# Altium footprint library con-samtec.PCBLIB: 805 footprints (part 48 of 55) (continued)
## TSW-142-02-S-D-RA [mil] (continued)
  rectangle: 340,0 360,170
  rectangle: 440,0 460,170
  rectangle: 540,0 560,170
  rectangle: 640,0 660,170
  rectangle: 740,0 760,170
  rectangle: 840,0 860,170
  rectangle: 940,0 960,170
  rectangle: 1040,0 1060,170
  rectangle: 1140,0 1160,170
  rectangle: 1240,0 1260,170
  rectangle: 1340,0 1360,170
  rectangle: 1440,0 1460,170
  rectangle: 1540,0 1560,170
  rectangle: 1640,0 1660,170
  rectangle: 1740,0 1760,170
  rectangle: 1840,0 1860,170
  rectangle: 1940,0 1960,170
  rectangle: 2040,0 2060,170

## TSW-142-02-S-Q [mm]
pads (84):
  oct 1.5x1.5 hole 1: 1(52.07,-2.54) 2(52.07,2.54) 3(49.53,-2.54) 4(49.53,2.54) 5(46.99,-2.54) 6(46.99,2.54) 7(44.45,-2.54) 8(44.45,2.54) 9(41.91,-2.54) 10(41.91,2.54) 11(39.37,-2.54) 12(39.37,2.54) 13(36.83,-2.54) 14(36.83,2.54) 15(34.29,-2.54) 16(34.29,2.54) 17(31.75,-2.54) 18(31.75,2.54) 19(29.21,-2.54) 20(29.21,2.54) 21(26.67,-2.54) 22(26.67,2.54) 23(24.13,-2.54) 24(24.13,2.54) 25(21.59,-2.54) 26(21.59,2.54) 27(19.05,-2.54) 28(19.05,2.54) 29(16.51,-2.54) 30(16.51,2.54) 31(13.97,-2.54) 32(13.97,2.54) 33(11.43,-2.54) 34(11.43,2.54) 35(8.89,-2.54) 36(8.89,2.54) 37(6.35,-2.54) 38(6.35,2.54) 39(3.81,-2.54) 40(3.81,2.54) 41(1.27,-2.54) 42(1.27,2.54) 43(-1.27,-2.54) 44(-1.27,2.54) 45(-3.81,-2.54) 46(-3.81,2.54) 47(-6.35,-2.54) 48(-6.35,2.54) 49(-8.89,-2.54) 50(-8.89,2.54) 51(-11.43,-2.54) 52(-11.43,2.54) 53(-13.97,-2.54) 54(-13.97,2.54) 55(-16.51,-2.54) 56(-16.51,2.54) 57(-19.05,-2.54) 58(-19.05,2.54) 59(-21.59,-2.54) 60(-21.59,2.54) 61(-24.13,-2.54) 62(-24.13,2.54) 63(-26.67,-2.54) 64(-26.67,2.54) 65(-29.21,-2.54) 66(-29.21,2.54) 67(-31.75,-2.54) 68(-31.75,2.54) 69(-34.29,-2.54) 70(-34.29,2.54) 71(-36.83,-2.54) 72(-36.83,2.54) 73(-39.37,-2.54) 74(-39.37,2.54) 75(-41.91,-2.54) 76(-41.91,2.54) 77(-44.45,-2.54) 78(-44.45,2.54) 79(-46.99,-2.54) 80(-46.99,2.54) 81(-49.53,-2.54) 82(-49.53,2.54) 83(-52.07,-2.54) 84(-52.07,2.54)
Top Overlay:
  lines w0.203: -53.469,-3.695 53.469,-3.695 53.469,3.695 -53.469,3.695 -53.469,-3.695
  text "1" at 51.912,-5.138 h0.94
  text "2" at 51.812,3.989 h0.94
Mechanical 16:
  rectangle: -52.42,-2.89 -51.72,-2.19
  rectangle: -52.42,2.19 -51.72,2.89
  rectangle: -49.88,-2.89 -49.18,-2.19
  rectangle: -49.88,2.19 -49.18,2.89
  rectangle: -47.34,-2.89 -46.64,-2.19
  rectangle: -47.34,2.19 -46.64,2.89
  rectangle: -44.8,-2.89 -44.1,-2.19
  rectangle: -44.8,2.19 -44.1,2.89
  rectangle: -42.26,-2.89 -41.56,-2.19
  rectangle: -42.26,2.19 -41.56,2.89
  rectangle: -39.72,-2.89 -39.02,-2.19
  rectangle: -39.72,2.19 -39.02,2.89
  rectangle: -37.18,-2.89 -36.48,-2.19
  rectangle: -37.18,2.19 -36.48,2.89
  rectangle: -34.64,-2.89 -33.94,-2.19
  rectangle: -34.64,2.19 -33.94,2.89
  rectangle: -32.1,-2.89 -31.4,-2.19
  rectangle: -32.1,2.19 -31.4,2.89
  rectangle: -29.56,-2.89 -28.86,-2.19
  rectangle: -29.56,2.19 -28.86,2.89
  rectangle: -27.02,-2.89 -26.32,-2.19
  rectangle: -27.02,2.19 -26.32,2.89
  rectangle: -24.48,-2.89 -23.78,-2.19
  rectangle: -24.48,2.19 -23.78,2.89
  rectangle: -21.94,-2.89 -21.24,-2.19
  rectangle: -21.94,2.19 -21.24,2.89
  rectangle: -19.4,-2.89 -18.7,-2.19
  rectangle: -19.4,2.19 -18.7,2.89
  rectangle: -16.86,-2.89 -16.16,-2.19
  rectangle: -16.86,2.19 -16.16,2.89
  rectangle: -14.32,-2.89 -13.62,-2.19
  rectangle: -14.32,2.19 -13.62,2.89
  rectangle: -11.78,-2.89 -11.08,-2.19
  rectangle: -11.78,2.19 -11.08,2.89
  rectangle: -9.24,-2.89 -8.54,-2.19
  rectangle: -9.24,2.19 -8.54,2.89
  rectangle: -6.7,-2.89 -6,-2.19
  rectangle: -6.7,2.19 -6,2.89
  rectangle: -4.16,-2.89 -3.46,-2.19
  rectangle: -4.16,2.19 -3.46,2.89
  rectangle: -1.62,-2.89 -0.92,-2.19
  rectangle: -1.62,2.19 -0.92,2.89
  rectangle: 0.92,-2.89 1.62,-2.19
  rectangle: 0.92,2.19 1.62,2.89
  rectangle: 3.46,-2.89 4.16,-2.19
  rectangle: 3.46,2.19 4.16,2.89
  rectangle: 6,-2.89 6.7,-2.19
  rectangle: 6,2.19 6.7,2.89
  rectangle: 8.54,-2.89 9.24,-2.19
  rectangle: 8.54,2.19 9.24,2.89
  rectangle: 11.08,-2.89 11.78,-2.19
  rectangle: 11.08,2.19 11.78,2.89
  rectangle: 13.62,-2.89 14.32,-2.19
  rectangle: 13.62,2.19 14.32,2.89
  rectangle: 16.16,-2.89 16.86,-2.19
  rectangle: 16.16,2.19 16.86,2.89
  rectangle: 18.7,-2.89 19.4,-2.19
  rectangle: 18.7,2.19 19.4,2.89
  rectangle: 21.24,-2.89 21.94,-2.19
  rectangle: 21.24,2.19 21.94,2.89
  rectangle: 23.78,-2.89 24.48,-2.19
  rectangle: 23.78,2.19 24.48,2.89
  rectangle: 26.32,-2.89 27.02,-2.19
  rectangle: 26.32,2.19 27.02,2.89
  rectangle: 28.86,-2.89 29.56,-2.19
  rectangle: 28.86,2.19 29.56,2.89
  rectangle: 31.4,-2.89 32.1,-2.19
  rectangle: 31.4,2.19 32.1,2.89
  rectangle: 33.94,-2.89 34.64,-2.19
  rectangle: 33.94,2.19 34.64,2.89
  rectangle: 36.48,-2.89 37.18,-2.19
  rectangle: 36.48,2.19 37.18,2.89
  rectangle: 39.02,-2.89 39.72,-2.19
  rectangle: 39.02,2.19 39.72,2.89
  rectangle: 41.56,-2.89 42.26,-2.19
  rectangle: 41.56,2.19 42.26,2.89
  rectangle: 44.1,-2.89 44.8,-2.19
  rectangle: 44.1,2.19 44.8,2.89
  rectangle: 46.64,-2.89 47.34,-2.19
  rectangle: 46.64,2.19 47.34,2.89
  rectangle: 49.18,-2.89 49.88,-2.19
  rectangle: 49.18,2.19 49.88,2.89
  rectangle: 51.72,-2.89 52.42,-2.19
  rectangle: 51.72,2.19 52.42,2.89

## TSW-142-02-S-Q-RA [mil]
pads (84):
  oct 59.06x59.06 hole 39.37: 1(2050,60) 2(2050,260) 3(1950,60) 4(1950,260) 5(1850,60) 6(1850,260) 7(1750,60) 8(1750,260) 9(1650,60) 10(1650,260) 11(1550,60) 12(1550,260) 13(1450,60) 14(1450,260) 15(1350,60) 16(1350,260) 17(1250,60) 18(1250,260) 19(1150,60) 20(1150,260) 21(1050,60) 22(1050,260) 23(950,60) 24(950,260) 25(850,60) 26(850,260) 27(750,60) 28(750,260) 29(650,60) 30(650,260) 31(550,60) 32(550,260) 33(450,60) 34(450,260) 35(350,60) 36(350,260) 37(250,60) 38(250,260) 39(150,60) 40(150,260) 41(50,60) 42(50,260) 43(-50,60) 44(-50,260) 45(-150,60) 46(-150,260) 47(-250,60) 48(-250,260) 49(-350,60) 50(-350,260) 51(-450,60) 52(-450,260) 53(-550,60) 54(-550,260) 55(-650,60) 56(-650,260) 57(-750,60) 58(-750,260) 59(-850,60) 60(-850,260) 61(-950,60) 62(-950,260) 63(-1050,60) 64(-1050,260) 65(-1150,60) 66(-1150,260) 67(-1250,60) 68(-1250,260) 69(-1350,60) 70(-1350,260) 71(-1450,60) 72(-1450,260) 73(-1550,60) 74(-1550,260) 75(-1650,60) 76(-1650,260) 77(-1750,60) 78(-1750,260) 79(-1850,60) 80(-1850,260) 81(-1950,60) 82(-1950,260) 83(-2050,60) 84(-2050,260)
Top Overlay:
  rectangle: -2060,-310.63 -2040,-80.32
  rectangle: -1960,-310.63 -1940,-80.32
  rectangle: -1860,-310.63 -1840,-80.32
  rectangle: -1760,-310.63 -1740,-80.32
  rectangle: -1660,-310.63 -1640,-80.32
  rectangle: -1560,-310.63 -1540,-80.32
  rectangle: -1460,-310.63 -1440,-80.32
  rectangle: -1360,-310.63 -1340,-80.32
  rectangle: -1260,-310.63 -1240,-80.32
  rectangle: -1160,-310.63 -1140,-80.32
  rectangle: -1060,-310.63 -1040,-80.32
  rectangle: -960,-310.63 -940,-80.32
  rectangle: -860,-310.63 -840,-80.32
  rectangle: -760,-310.63 -740,-80.32
  rectangle: -660,-310.63 -640,-80.32
  rectangle: -560,-310.63 -540,-80.32
  rectangle: -460,-310.63 -440,-80.32
  rectangle: -360,-310.63 -340,-80.32
  rectangle: -260,-310.63 -240,-80.32
  rectangle: -160,-310.63 -140,-80.32
  rectangle: -60,-310.63 -40,-80.32
  rectangle: 40,-310.63 60,-80.32
  rectangle: 140,-310.63 160,-80.32
  rectangle: 240,-310.63 260,-80.32
  rectangle: 340,-310.63 360,-80.32
  rectangle: 440,-310.63 460,-80.32
  rectangle: 540,-310.63 560,-80.32
  rectangle: 640,-310.63 660,-80.32
  rectangle: 740,-310.63 760,-80.32
  rectangle: 840,-310.63 860,-80.32
  rectangle: 940,-310.63 960,-80.32
  rectangle: 1040,-310.63 1060,-80.32
  rectangle: 1140,-310.63 1160,-80.32
  rectangle: 1240,-310.63 1260,-80.32
  rectangle: 1340,-310.63 1360,-80.32
  rectangle: 1440,-310.63 1460,-80.32
  rectangle: 1540,-310.63 1560,-80.32
  rectangle: 1640,-310.63 1660,-80.32
  rectangle: 1740,-310.63 1760,-80.32
  rectangle: 1840,-310.63 1860,-80.32
  rectangle: 1940,-310.63 1960,-80.32
  rectangle: 2040,-310.63 2060,-80.32
  lines w8: -2105.08,-80.55 2105.08,-80.55 2105.08,-4.17 -2105.08,-4.17 -2105.08,-80.55
  text "1" at 2103.54,43.31 h36.81
  text "2" at 2101.18,242.72 h36.81
Mechanical 16:
  rectangle: -2060,0 -2040,270
  rectangle: -1960,0 -1940,270
  rectangle: -1860,0 -1840,270
  rectangle: -1760,0 -1740,270
  rectangle: -1660,0 -1640,270
  rectangle: -1560,0 -1540,270
  rectangle: -1460,0 -1440,270
  rectangle: -1360,0 -1340,270
  rectangle: -1260,0 -1240,270
  rectangle: -1160,0 -1140,270
  rectangle: -1060,0 -1040,270
  rectangle: -960,0 -940,270
  rectangle: -860,0 -840,270
  rectangle: -760,0 -740,270
  rectangle: -660,0 -640,270
  rectangle: -560,0 -540,270
  rectangle: -460,0 -440,270
  rectangle: -360,0 -340,270
  rectangle: -260,0 -240,270
  rectangle: -160,0 -140,270
  rectangle: -60,0 -40,270
  rectangle: 40,0 60,270
  rectangle: 140,0 160,270
  rectangle: 240,0 260,270
  rectangle: 340,0 360,270
  rectangle: 440,0 460,270
  rectangle: 540,0 560,270
  rectangle: 640,0 660,270
  rectangle: 740,0 760,270
  rectangle: 840,0 860,270
  rectangle: 940,0 960,270
  rectangle: 1040,0 1060,270
  rectangle: 1140,0 1160,270
  rectangle: 1240,0 1260,270
  rectangle: 1340,0 1360,270
  rectangle: 1440,0 1460,270
  rectangle: 1540,0 1560,270
  rectangle: 1640,0 1660,270
  rectangle: 1740,0 1760,270
  rectangle: 1840,0 1860,270
  rectangle: 1940,0 1960,270
  rectangle: 2040,0 2060,270

## TSW-142-02-S-S [mm]
pads (42):
  oct 1.5x1.5 hole 1: 1(52.07,0) 2(49.53,0) 3(46.99,0) 4(44.45,0) 5(41.91,0) 6(39.37,0) 7(36.83,0) 8(34.29,0) 9(31.75,0) 10(29.21,0) 11(26.67,0) 12(24.13,0) 13(21.59,0) 14(19.05,0) 15(16.51,0) 16(13.97,0) 17(11.43,0) 18(8.89,0) 19(6.35,0) 20(3.81,0) 21(1.27,0) 22(-1.27,0) 23(-3.81,0) 24(-6.35,0) 25(-8.89,0) 26(-11.43,0) 27(-13.97,0) 28(-16.51,0) 29(-19.05,0) 30(-21.59,0) 31(-24.13,0) 32(-26.67,0) 33(-29.21,0) 34(-31.75,0) 35(-34.29,0) 36(-36.83,0) 37(-39.37,0) 38(-41.91,0) 39(-44.45,0) 40(-46.99,0) 41(-49.53,0) 42(-52.07,0)
Top Overlay:
  lines w0.203: -53.469,-1.155 53.469,-1.155 53.469,1.155 -53.469,1.155 -53.469,-1.155
  text "1" at 51.812,-2.498 h0.94
Mechanical 16:
  rectangle: -52.42,-0.35 -51.72,0.35
  rectangle: -49.88,-0.35 -49.18,0.35
  rectangle: -47.34,-0.35 -46.64,0.35
  rectangle: -44.8,-0.35 -44.1,0.35
  rectangle: -42.26,-0.35 -41.56,0.35
  rectangle: -39.72,-0.35 -39.02,0.35
  rectangle: -37.18,-0.35 -36.48,0.35
  rectangle: -34.64,-0.35 -33.94,0.35
  rectangle: -32.1,-0.35 -31.4,0.35
  rectangle: -29.56,-0.35 -28.86,0.35
  rectangle: -27.02,-0.35 -26.32,0.35
  rectangle: -24.48,-0.35 -23.78,0.35
  rectangle: -21.94,-0.35 -21.24,0.35
  rectangle: -19.4,-0.35 -18.7,0.35
  rectangle: -16.86,-0.35 -16.16,0.35
  rectangle: -14.32,-0.35 -13.62,0.35
  rectangle: -11.78,-0.35 -11.08,0.35
  rectangle: -9.24,-0.35 -8.54,0.35
  rectangle: -6.7,-0.35 -6,0.35
  rectangle: -4.16,-0.35 -3.46,0.35
  rectangle: -1.62,-0.35 -0.92,0.35
  rectangle: 0.92,-0.35 1.62,0.35
  rectangle: 3.46,-0.35 4.16,0.35
  rectangle: 6,-0.35 6.7,0.35
  rectangle: 8.54,-0.35 9.24,0.35
  rectangle: 11.08,-0.35 11.78,0.35
  rectangle: 13.62,-0.35 14.32,0.35
  rectangle: 16.16,-0.35 16.86,0.35
  rectangle: 18.7,-0.35 19.4,0.35
  rectangle: 21.24,-0.35 21.94,0.35
  rectangle: 23.78,-0.35 24.48,0.35
  rectangle: 26.32,-0.35 27.02,0.35
  rectangle: 28.86,-0.35 29.56,0.35
  rectangle: 31.4,-0.35 32.1,0.35
  rectangle: 33.94,-0.35 34.64,0.35
  rectangle: 36.48,-0.35 37.18,0.35
  rectangle: 39.02,-0.35 39.72,0.35
  rectangle: 41.56,-0.35 42.26,0.35
  rectangle: 44.1,-0.35 44.8,0.35
  rectangle: 46.64,-0.35 47.34,0.35
  rectangle: 49.18,-0.35 49.88,0.35
  rectangle: 51.72,-0.35 52.42,0.35

## TSW-142-02-S-S-RA [mil]
pads (42):
  oct 59.06x59.06 hole 39.37: 1(2050,60) 2(1950,60) 3(1850,60) 4(1750,60) 5(1650,60) 6(1550,60) 7(1450,60) 8(1350,60) 9(1250,60) 10(1150,60) 11(1050,60) 12(950,60) 13(850,60) 14(750,60) 15(650,60) 16(550,60) 17(450,60) 18(350,60) 19(250,60) 20(150,60) 21(50,60) 22(-50,60) 23(-150,60) 24(-250,60) 25(-350,60) 26(-450,60) 27(-550,60) 28(-650,60) 29(-750,60) 30(-850,60) 31(-950,60) 32(-1050,60) 33(-1150,60) 34(-1250,60) 35(-1350,60) 36(-1450,60) 37(-1550,60) 38(-1650,60) 39(-1750,60) 40(-1850,60) 41(-1950,60) 42(-2050,60)
Top Overlay:
  rectangle: -2060,-310.63 -2040,-80.32
  rectangle: -1960,-310.63 -1940,-80.32
  rectangle: -1860,-310.63 -1840,-80.32
  rectangle: -1760,-310.63 -1740,-80.32
  rectangle: -1660,-310.63 -1640,-80.32
  rectangle: -1560,-310.63 -1540,-80.32
  rectangle: -1460,-310.63 -1440,-80.32
  rectangle: -1360,-310.63 -1340,-80.32
  rectangle: -1260,-310.63 -1240,-80.32
  rectangle: -1160,-310.63 -1140,-80.32
  rectangle: -1060,-310.63 -1040,-80.32
  rectangle: -960,-310.63 -940,-80.32
  rectangle: -860,-310.63 -840,-80.32
  rectangle: -760,-310.63 -740,-80.32
  rectangle: -660,-310.63 -640,-80.32
  rectangle: -560,-310.63 -540,-80.32
  rectangle: -460,-310.63 -440,-80.32
  rectangle: -360,-310.63 -340,-80.32
  rectangle: -260,-310.63 -240,-80.32
  rectangle: -160,-310.63 -140,-80.32
  rectangle: -60,-310.63 -40,-80.32
  rectangle: 40,-310.63 60,-80.32
  rectangle: 140,-310.63 160,-80.32
  rectangle: 240,-310.63 260,-80.32
  rectangle: 340,-310.63 360,-80.32
  rectangle: 440,-310.63 460,-80.32
  rectangle: 540,-310.63 560,-80.32
  rectangle: 640,-310.63 660,-80.32
  rectangle: 740,-310.63 760,-80.32
  rectangle: 840,-310.63 860,-80.32
  rectangle: 940,-310.63 960,-80.32
  rectangle: 1040,-310.63 1060,-80.32
  rectangle: 1140,-310.63 1160,-80.32
  rectangle: 1240,-310.63 1260,-80.32
  rectangle: 1340,-310.63 1360,-80.32
  rectangle: 1440,-310.63 1460,-80.32
  rectangle: 1540,-310.63 1560,-80.32
  rectangle: 1640,-310.63 1660,-80.32
  rectangle: 1740,-310.63 1760,-80.32
  rectangle: 1840,-310.63 1860,-80.32
  rectangle: 1940,-310.63 1960,-80.32
  rectangle: 2040,-310.63 2060,-80.32
  lines w8: -2105.08,-80.55 2105.08,-80.55 2105.08,-4.17 -2105.08,-4.17 -2105.08,-80.55
  text "1" at 2100.47,45.35 h36.81
Mechanical 16:
  rectangle: -2060,0 -2040,70
  rectangle: -1960,0 -1940,70
  rectangle: -1860,0 -1840,70
  rectangle: -1760,0 -1740,70
  rectangle: -1660,0 -1640,70
  rectangle: -1560,0 -1540,70
  rectangle: -1460,0 -1440,70
  rectangle: -1360,0 -1340,70
  rectangle: -1260,0 -1240,70
  rectangle: -1160,0 -1140,70
  rectangle: -1060,0 -1040,70
  rectangle: -960,0 -940,70
  rectangle: -860,0 -840,70
  rectangle: -760,0 -740,70
  rectangle: -660,0 -640,70
  rectangle: -560,0 -540,70
  rectangle: -460,0 -440,70
  rectangle: -360,0 -340,70
  rectangle: -260,0 -240,70
  rectangle: -160,0 -140,70
  rectangle: -60,0 -40,70
  rectangle: 40,0 60,70
  rectangle: 140,0 160,70
  rectangle: 240,0 260,70
  rectangle: 340,0 360,70
  rectangle: 440,0 460,70
  rectangle: 540,0 560,70
  rectangle: 640,0 660,70
  rectangle: 740,0 760,70
  rectangle: 840,0 860,70
  rectangle: 940,0 960,70
  rectangle: 1040,0 1060,70
  rectangle: 1140,0 1160,70
  rectangle: 1240,0 1260,70
  rectangle: 1340,0 1360,70
  rectangle: 1440,0 1460,70
  rectangle: 1540,0 1560,70
  rectangle: 1640,0 1660,70
  rectangle: 1740,0 1760,70
  rectangle: 1840,0 1860,70
  rectangle: 1940,0 1960,70
  rectangle: 2040,0 2060,70

## TSW-142-02-S-T [mm]
pads (126):
  oct 1.5x1.5 hole 1: 1(52.07,-2.54) 2(52.07,0) 3(52.07,2.54) 4(49.53,-2.54) 5(49.53,0) 6(49.53,2.54) 7(46.99,-2.54) 8(46.99,0) 9(46.99,2.54) 10(44.45,-2.54) 11(44.45,0) 12(44.45,2.54) 13(41.91,-2.54) 14(41.91,0) 15(41.91,2.54) 16(39.37,-2.54) 17(39.37,0) 18(39.37,2.54) 19(36.83,-2.54) 20(36.83,0) 21(36.83,2.54) 22(34.29,-2.54) 23(34.29,0) 24(34.29,2.54) 25(31.75,-2.54) 26(31.75,0) 27(31.75,2.54) 28(29.21,-2.54) 29(29.21,0) 30(29.21,2.54) 31(26.67,-2.54) 32(26.67,0) 33(26.67,2.54) 34(24.13,-2.54) 35(24.13,0) 36(24.13,2.54) 37(21.59,-2.54) 38(21.59,0) 39(21.59,2.54) 40(19.05,-2.54) 41(19.05,0) 42(19.05,2.54) 43(16.51,-2.54) 44(16.51,0) 45(16.51,2.54) 46(13.97,-2.54) 47(13.97,0) 48(13.97,2.54) 49(11.43,-2.54) 50(11.43,0) 51(11.43,2.54) 52(8.89,-2.54) 53(8.89,0) 54(8.89,2.54) 55(6.35,-2.54) 56(6.35,0) 57(6.35,2.54) 58(3.81,-2.54) 59(3.81,0) 60(3.81,2.54) 61(1.27,-2.54) 62(1.27,0) 63(1.27,2.54) 64(-1.27,-2.54) 65(-1.27,0) 66(-1.27,2.54) 67(-3.81,-2.54) 68(-3.81,0) 69(-3.81,2.54) 70(-6.35,-2.54) 71(-6.35,0) 72(-6.35,2.54) 73(-8.89,-2.54) 74(-8.89,0) 75(-8.89,2.54) 76(-11.43,-2.54) 77(-11.43,0) 78(-11.43,2.54) 79(-13.97,-2.54) 80(-13.97,0) 81(-13.97,2.54) 82(-16.51,-2.54) 83(-16.51,0) 84(-16.51,2.54) 85(-19.05,-2.54) 86(-19.05,0) 87(-19.05,2.54) 88(-21.59,-2.54) 89(-21.59,0) 90(-21.59,2.54) 91(-24.13,-2.54) 92(-24.13,0) 93(-24.13,2.54) 94(-26.67,-2.54) 95(-26.67,0) 96(-26.67,2.54) 97(-29.21,-2.54) 98(-29.21,0) 99(-29.21,2.54) 100(-31.75,-2.54) 101(-31.75,0) 102(-31.75,2.54) 103(-34.29,-2.54) 104(-34.29,0) 105(-34.29,2.54) 106(-36.83,-2.54) 107(-36.83,0) 108(-36.83,2.54) 109(-39.37,-2.54) 110(-39.37,0) 111(-39.37,2.54) 112(-41.91,-2.54) 113(-41.91,0) 114(-41.91,2.54) 115(-44.45,-2.54) 116(-44.45,0) 117(-44.45,2.54) 118(-46.99,-2.54) 119(-46.99,0) 120(-46.99,2.54) 121(-49.53,-2.54) 122(-49.53,0) 123(-49.53,2.54) 124(-52.07,-2.54) 125(-52.07,0) 126(-52.07,2.54)
Top Overlay:
  lines w0.203: -53.469,-3.695 53.469,-3.695 53.469,3.695 -53.469,3.695 -53.469,-3.695
  text "1" at 51.762,-5.188 h0.94
  text "3" at 51.758,3.989 h0.94
Mechanical 16:
  rectangle: -52.42,-2.89 -51.72,-2.19
  rectangle: -52.42,-0.35 -51.72,0.35
  rectangle: -52.42,2.19 -51.72,2.89
  rectangle: -49.88,-2.89 -49.18,-2.19
  rectangle: -49.88,-0.35 -49.18,0.35
  rectangle: -49.88,2.19 -49.18,2.89
  rectangle: -47.34,-2.89 -46.64,-2.19
  rectangle: -47.34,-0.35 -46.64,0.35
  rectangle: -47.34,2.19 -46.64,2.89
  rectangle: -44.8,-2.89 -44.1,-2.19
  rectangle: -44.8,-0.35 -44.1,0.35
  rectangle: -44.8,2.19 -44.1,2.89
  rectangle: -42.26,-2.89 -41.56,-2.19
  rectangle: -42.26,-0.35 -41.56,0.35
  rectangle: -42.26,2.19 -41.56,2.89
  rectangle: -39.72,-2.89 -39.02,-2.19
  rectangle: -39.72,-0.35 -39.02,0.35
  rectangle: -39.72,2.19 -39.02,2.89
  rectangle: -37.18,-2.89 -36.48,-2.19
  rectangle: -37.18,-0.35 -36.48,0.35
  rectangle: -37.18,2.19 -36.48,2.89
  rectangle: -34.64,-2.89 -33.94,-2.19
  rectangle: -34.64,-0.35 -33.94,0.35
  rectangle: -34.64,2.19 -33.94,2.89
  rectangle: -32.1,-2.89 -31.4,-2.19
  rectangle: -32.1,-0.35 -31.4,0.35
  rectangle: -32.1,2.19 -31.4,2.89
  rectangle: -29.56,-2.89 -28.86,-2.19
  rectangle: -29.56,-0.35 -28.86,0.35
  rectangle: -29.56,2.19 -28.86,2.89
  rectangle: -27.02,-2.89 -26.32,-2.19
  rectangle: -27.02,-0.35 -26.32,0.35
  rectangle: -27.02,2.19 -26.32,2.89
  rectangle: -24.48,-2.89 -23.78,-2.19
  rectangle: -24.48,-0.35 -23.78,0.35
  rectangle: -24.48,2.19 -23.78,2.89
  rectangle: -21.94,-2.89 -21.24,-2.19
  rectangle: -21.94,-0.35 -21.24,0.35
  rectangle: -21.94,2.19 -21.24,2.89
  rectangle: -19.4,-2.89 -18.7,-2.19
  rectangle: -19.4,-0.35 -18.7,0.35
  rectangle: -19.4,2.19 -18.7,2.89
  rectangle: -16.86,-2.89 -16.16,-2.19
  rectangle: -16.86,-0.35 -16.16,0.35
  rectangle: -16.86,2.19 -16.16,2.89
  rectangle: -14.32,-2.89 -13.62,-2.19
  rectangle: -14.32,-0.35 -13.62,0.35
  rectangle: -14.32,2.19 -13.62,2.89
  rectangle: -11.78,-2.89 -11.08,-2.19
  rectangle: -11.78,-0.35 -11.08,0.35
  rectangle: -11.78,2.19 -11.08,2.89
  rectangle: -9.24,-2.89 -8.54,-2.19
  rectangle: -9.24,-0.35 -8.54,0.35
  rectangle: -9.24,2.19 -8.54,2.89
  rectangle: -6.7,-2.89 -6,-2.19
  rectangle: -6.7,-0.35 -6,0.35
  rectangle: -6.7,2.19 -6,2.89
  rectangle: -4.16,-2.89 -3.46,-2.19
  rectangle: -4.16,-0.35 -3.46,0.35
  rectangle: -4.16,2.19 -3.46,2.89
  rectangle: -1.62,-2.89 -0.92,-2.19
  rectangle: -1.62,-0.35 -0.92,0.35
  rectangle: -1.62,2.19 -0.92,2.89
  rectangle: 0.92,-2.89 1.62,-2.19
  rectangle: 0.92,-0.35 1.62,0.35
  rectangle: 0.92,2.19 1.62,2.89
  rectangle: 3.46,-2.89 4.16,-2.19
  rectangle: 3.46,-0.35 4.16,0.35
  rectangle: 3.46,2.19 4.16,2.89
  rectangle: 6,-2.89 6.7,-2.19
  rectangle: 6,-0.35 6.7,0.35
  rectangle: 6,2.19 6.7,2.89
  rectangle: 8.54,-2.89 9.24,-2.19
  rectangle: 8.54,-0.35 9.24,0.35
  rectangle: 8.54,2.19 9.24,2.89
  rectangle: 11.08,-2.89 11.78,-2.19
  rectangle: 11.08,-0.35 11.78,0.35
  rectangle: 11.08,2.19 11.78,2.89
  rectangle: 13.62,-2.89 14.32,-2.19
  rectangle: 13.62,-0.35 14.32,0.35
  rectangle: 13.62,2.19 14.32,2.89
  rectangle: 16.16,-2.89 16.86,-2.19
  rectangle: 16.16,-0.35 16.86,0.35
  rectangle: 16.16,2.19 16.86,2.89
  rectangle: 18.7,-2.89 19.4,-2.19
  rectangle: 18.7,-0.35 19.4,0.35
  rectangle: 18.7,2.19 19.4,2.89
  rectangle: 21.24,-2.89 21.94,-2.19
  rectangle: 21.24,-0.35 21.94,0.35
  rectangle: 21.24,2.19 21.94,2.89
  rectangle: 23.78,-2.89 24.48,-2.19
  rectangle: 23.78,-0.35 24.48,0.35
  rectangle: 23.78,2.19 24.48,2.89
  rectangle: 26.32,-2.89 27.02,-2.19
  rectangle: 26.32,-0.35 27.02,0.35
  rectangle: 26.32,2.19 27.02,2.89
  rectangle: 28.86,-2.89 29.56,-2.19
  rectangle: 28.86,-0.35 29.56,0.35
  rectangle: 28.86,2.19 29.56,2.89
  rectangle: 31.4,-2.89 32.1,-2.19
  rectangle: 31.4,-0.35 32.1,0.35
  rectangle: 31.4,2.19 32.1,2.89
  rectangle: 33.94,-2.89 34.64,-2.19
  rectangle: 33.94,-0.35 34.64,0.35
  rectangle: 33.94,2.19 34.64,2.89
  rectangle: 36.48,-2.89 37.18,-2.19
  rectangle: 36.48,-0.35 37.18,0.35
  rectangle: 36.48,2.19 37.18,2.89
  rectangle: 39.02,-2.89 39.72,-2.19
  rectangle: 39.02,-0.35 39.72,0.35
  rectangle: 39.02,2.19 39.72,2.89
  rectangle: 41.56,-2.89 42.26,-2.19
  rectangle: 41.56,-0.35 42.26,0.35
  rectangle: 41.56,2.19 42.26,2.89
  rectangle: 44.1,-2.89 44.8,-2.19
  rectangle: 44.1,-0.35 44.8,0.35
  rectangle: 44.1,2.19 44.8,2.89
  rectangle: 46.64,-2.89 47.34,-2.19
  rectangle: 46.64,-0.35 47.34,0.35
  rectangle: 46.64,2.19 47.34,2.89
  rectangle: 49.18,-2.89 49.88,-2.19
  rectangle: 49.18,-0.35 49.88,0.35
  rectangle: 49.18,2.19 49.88,2.89
  rectangle: 51.72,-2.89 52.42,-2.19
  rectangle: 51.72,-0.35 52.42,0.35
  rectangle: 51.72,2.19 52.42,2.89

## TSW-142-02-S-T-RA [mil]
pads (126):
  oct 59.06x59.06 hole 39.37: 1(2050,60) 2(2050,160) 3(2050,260) 4(1950,60) 5(1950,160) 6(1950,260) 7(1850,60) 8(1850,160) 9(1850,260) 10(1750,60) 11(1750,160) 12(1750,260) 13(1650,60) 14(1650,160) 15(1650,260) 16(1550,60) 17(1550,160) 18(1550,260) 19(1450,60) 20(1450,160) 21(1450,260) 22(1350,60) 23(1350,160) 24(1350,260) 25(1250,60) 26(1250,160) 27(1250,260) 28(1150,60) 29(1150,160) 30(1150,260) 31(1050,60) 32(1050,160) 33(1050,260) 34(950,60) 35(950,160) 36(950,260) 37(850,60) 38(850,160) 39(850,260) 40(750,60) 41(750,160) 42(750,260) 43(650,60) 44(650,160) 45(650,260) 46(550,60) 47(550,160) 48(550,260) 49(450,60) 50(450,160) 51(450,260) 52(350,60) 53(350,160) 54(350,260) 55(250,60) 56(250,160) 57(250,260) 58(150,60) 59(150,160) 60(150,260) 61(50,60) 62(50,160) 63(50,260) 64(-50,60) 65(-50,160) 66(-50,260) 67(-150,60) 68(-150,160) 69(-150,260) 70(-250,60) 71(-250,160) 72(-250,260) 73(-350,60) 74(-350,160) 75(-350,260) 76(-450,60) 77(-450,160) 78(-450,260) 79(-550,60) 80(-550,160) 81(-550,260) 82(-650,60) 83(-650,160) 84(-650,260) 85(-750,60) 86(-750,160) 87(-750,260) 88(-850,60) 89(-850,160) 90(-850,260) 91(-950,60) 92(-950,160) 93(-950,260) 94(-1050,60) 95(-1050,160) 96(-1050,260) 97(-1150,60) 98(-1150,160) 99(-1150,260) 100(-1250,60) 101(-1250,160) 102(-1250,260) 103(-1350,60) 104(-1350,160) 105(-1350,260) 106(-1450,60) 107(-1450,160) 108(-1450,260) 109(-1550,60) 110(-1550,160) 111(-1550,260) 112(-1650,60) 113(-1650,160) 114(-1650,260) 115(-1750,60) 116(-1750,160) 117(-1750,260) 118(-1850,60) 119(-1850,160) 120(-1850,260) 121(-1950,60) 122(-1950,160) 123(-1950,260) 124(-2050,60) 125(-2050,160) 126(-2050,260)
Top Overlay:
  rectangle: -2060,-310.63 -2040,-80.32
  rectangle: -1960,-310.63 -1940,-80.32
  rectangle: -1860,-310.63 -1840,-80.32
  rectangle: -1760,-310.63 -1740,-80.32
  rectangle: -1660,-310.63 -1640,-80.32
  rectangle: -1560,-310.63 -1540,-80.32
  rectangle: -1460,-310.63 -1440,-80.32
  rectangle: -1360,-310.63 -1340,-80.32
  rectangle: -1260,-310.63 -1240,-80.32
  rectangle: -1160,-310.63 -1140,-80.32
  rectangle: -1060,-310.63 -1040,-80.32
  rectangle: -960,-310.63 -940,-80.32
  rectangle: -860,-310.63 -840,-80.32
  rectangle: -760,-310.63 -740,-80.32
  rectangle: -660,-310.63 -640,-80.32
  rectangle: -560,-310.63 -540,-80.32
  rectangle: -460,-310.63 -440,-80.32
  rectangle: -360,-310.63 -340,-80.32
  rectangle: -260,-310.63 -240,-80.32
  rectangle: -160,-310.63 -140,-80.32
  rectangle: -60,-310.63 -40,-80.32
  rectangle: 40,-310.63 60,-80.32
  rectangle: 140,-310.63 160,-80.32
  rectangle: 240,-310.63 260,-80.32
  rectangle: 340,-310.63 360,-80.32
  rectangle: 440,-310.63 460,-80.32
  rectangle: 540,-310.63 560,-80.32
  rectangle: 640,-310.63 660,-80.32
  rectangle: 740,-310.63 760,-80.32
  rectangle: 840,-310.63 860,-80.32
  rectangle: 940,-310.63 960,-80.32
  rectangle: 1040,-310.63 1060,-80.32
  rectangle: 1140,-310.63 1160,-80.32
  rectangle: 1240,-310.63 1260,-80.32
  rectangle: 1340,-310.63 1360,-80.32
  rectangle: 1440,-310.63 1460,-80.32
  rectangle: 1540,-310.63 1560,-80.32
  rectangle: 1640,-310.63 1660,-80.32
  rectangle: 1740,-310.63 1760,-80.32
  rectangle: 1840,-310.63 1860,-80.32
  rectangle: 1940,-310.63 1960,-80.32
  rectangle: 2040,-310.63 2060,-80.32
  lines w8: -2105.08,-80.55 2105.08,-80.55 2105.08,-4.17 -2105.08,-4.17 -2105.08,-80.55
  text "1" at 2101.57,41.34 h36.81
  text "3" at 2102.17,236.81 h36.81
Mechanical 16:
  rectangle: -2060,0 -2040,270
  rectangle: -1960,0 -1940,270
  rectangle: -1860,0 -1840,270
  rectangle: -1760,0 -1740,270
  rectangle: -1660,0 -1640,270
  rectangle: -1560,0 -1540,270
  rectangle: -1460,0 -1440,270
  rectangle: -1360,0 -1340,270
  rectangle: -1260,0 -1240,270
  rectangle: -1160,0 -1140,270
  rectangle: -1060,0 -1040,270
  rectangle: -960,0 -940,270
  rectangle: -860,0 -840,270
  rectangle: -760,0 -740,270
  rectangle: -660,0 -640,270
  rectangle: -560,0 -540,270
  rectangle: -460,0 -440,270
  rectangle: -360,0 -340,270
  rectangle: -260,0 -240,270
  rectangle: -160,0 -140,270
  rectangle: -60,0 -40,270
  rectangle: 40,0 60,270
  rectangle: 140,0 160,270
  rectangle: 240,0 260,270
  rectangle: 340,0 360,270
  rectangle: 440,0 460,270
  rectangle: 540,0 560,270
  rectangle: 640,0 660,270
  rectangle: 740,0 760,270
  rectangle: 840,0 860,270
  rectangle: 940,0 960,270
  rectangle: 1040,0 1060,270
  rectangle: 1140,0 1160,270
  rectangle: 1240,0 1260,270
  rectangle: 1340,0 1360,270
  rectangle: 1440,0 1460,270
  rectangle: 1540,0 1560,270
  rectangle: 1640,0 1660,270
  rectangle: 1740,0 1760,270
  rectangle: 1840,0 1860,270
  rectangle: 1940,0 1960,270
  rectangle: 2040,0 2060,270